# Altium footprint library TSC Footprints.PcbLib: 99 footprints (part 7 of 7)
Each footprint in its own frame and in the unit in brackets; x right, y up, seen from the top. Pads: shape width x height; smd on the part's side, far side on the other; paste and mask are expansions set on the pad; w line width, h text height; cw(c..) or ccw(c..) is an arc to the next point about the centre after c.
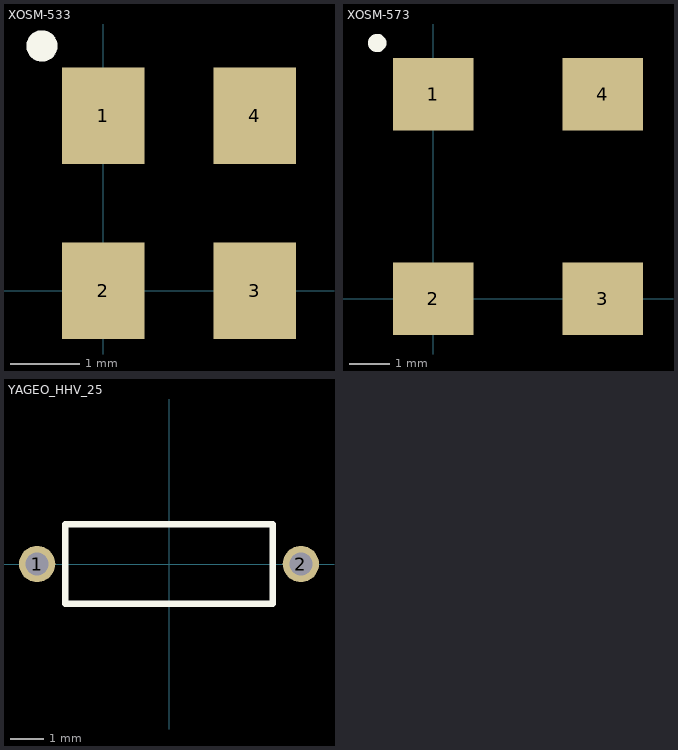
[diagram p6: the footprints below, top view; thin cyan lines are the x and y axes]

## XOSM-533 [mm]
height 1.3
pads (4):
  rect 1.2x1.4 smd: 1(0,2.54) 2(0,0) 3(2.2,0) 4(2.2,2.54)
Top Overlay:
  circle w0.254: c-0.889,3.556 r0.1

## XOSM-573 [mm]
height 1.9
pads (4):
  rect 2x1.8 smd: 1(0,5.08) 2(0,0) 3(4.2,0) 4(4.2,5.08)
Top Overlay:
  circle w0.254: c-1.397,6.35 r0.1

## YAGEO_HHV_25 [mm]
height 2.4
pads (2):
  round 1.1 hole 0.7: 1(-4,0) 2(4,0)
Top Overlay:
  lines w0.2: -3.15,-1.2 3.15,-1.2 3.15,1.2 -3.15,1.2 -3.15,-1.2
3D body: height 2.39, standoff 0, extent -3.15,-1.198 3.15,1.198